# Altium footprint library relay.PcbLib: 1 footprints
Each footprint in its own frame and in the unit in brackets; x right, y up, seen from the top. Pads: shape width x height; smd on the part's side, far side on the other; paste and mask are expansions set on the pad; w line width, h text height; cw(c..) or ccw(c..) is an arc to the next point about the centre after c.
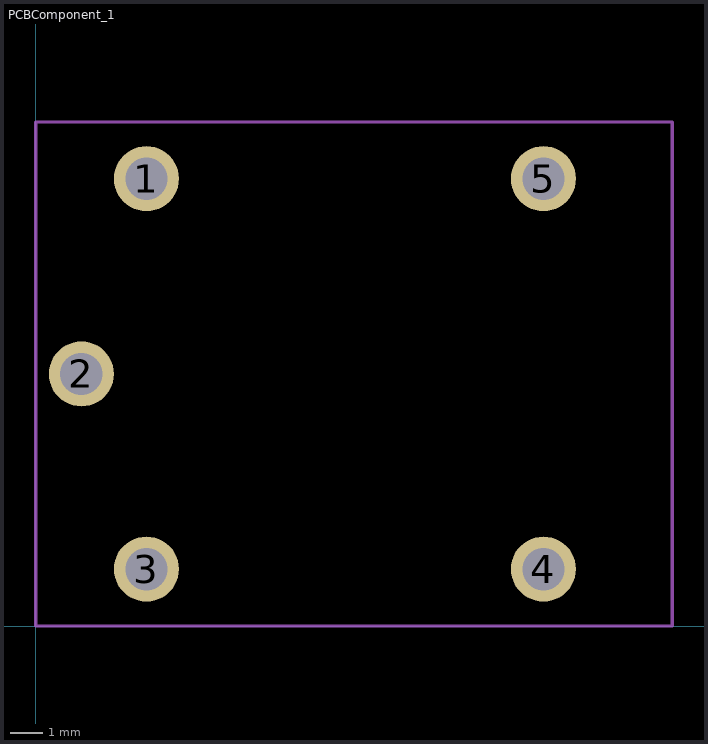
[diagram p0: the footprint, top view; thin cyan lines are the x and y axes]

## PCBComponent_1 [mm]
pads (5):
  round 2 hole 1.3: 1(3.4,13.75) 2(1.4,7.75) 3(3.4,1.75) 4(15.6,1.75) 5(15.6,13.75)
Mechanical 1:
  lines w0.1: 0,0 0,15.494 19.558,15.494 19.558,0 0,0